# Altium footprint library Reflow3D1411sep.PcbLib: 657 footprints (part 27 of 42)
Each footprint in its own frame and in the unit in brackets; x right, y up, seen from the top. Pads: shape width x height; smd on the part's side, far side on the other; paste and mask are expansions set on the pad; w line width, h text height; cw(c..) or ccw(c..) is an arc to the next point about the centre after c.
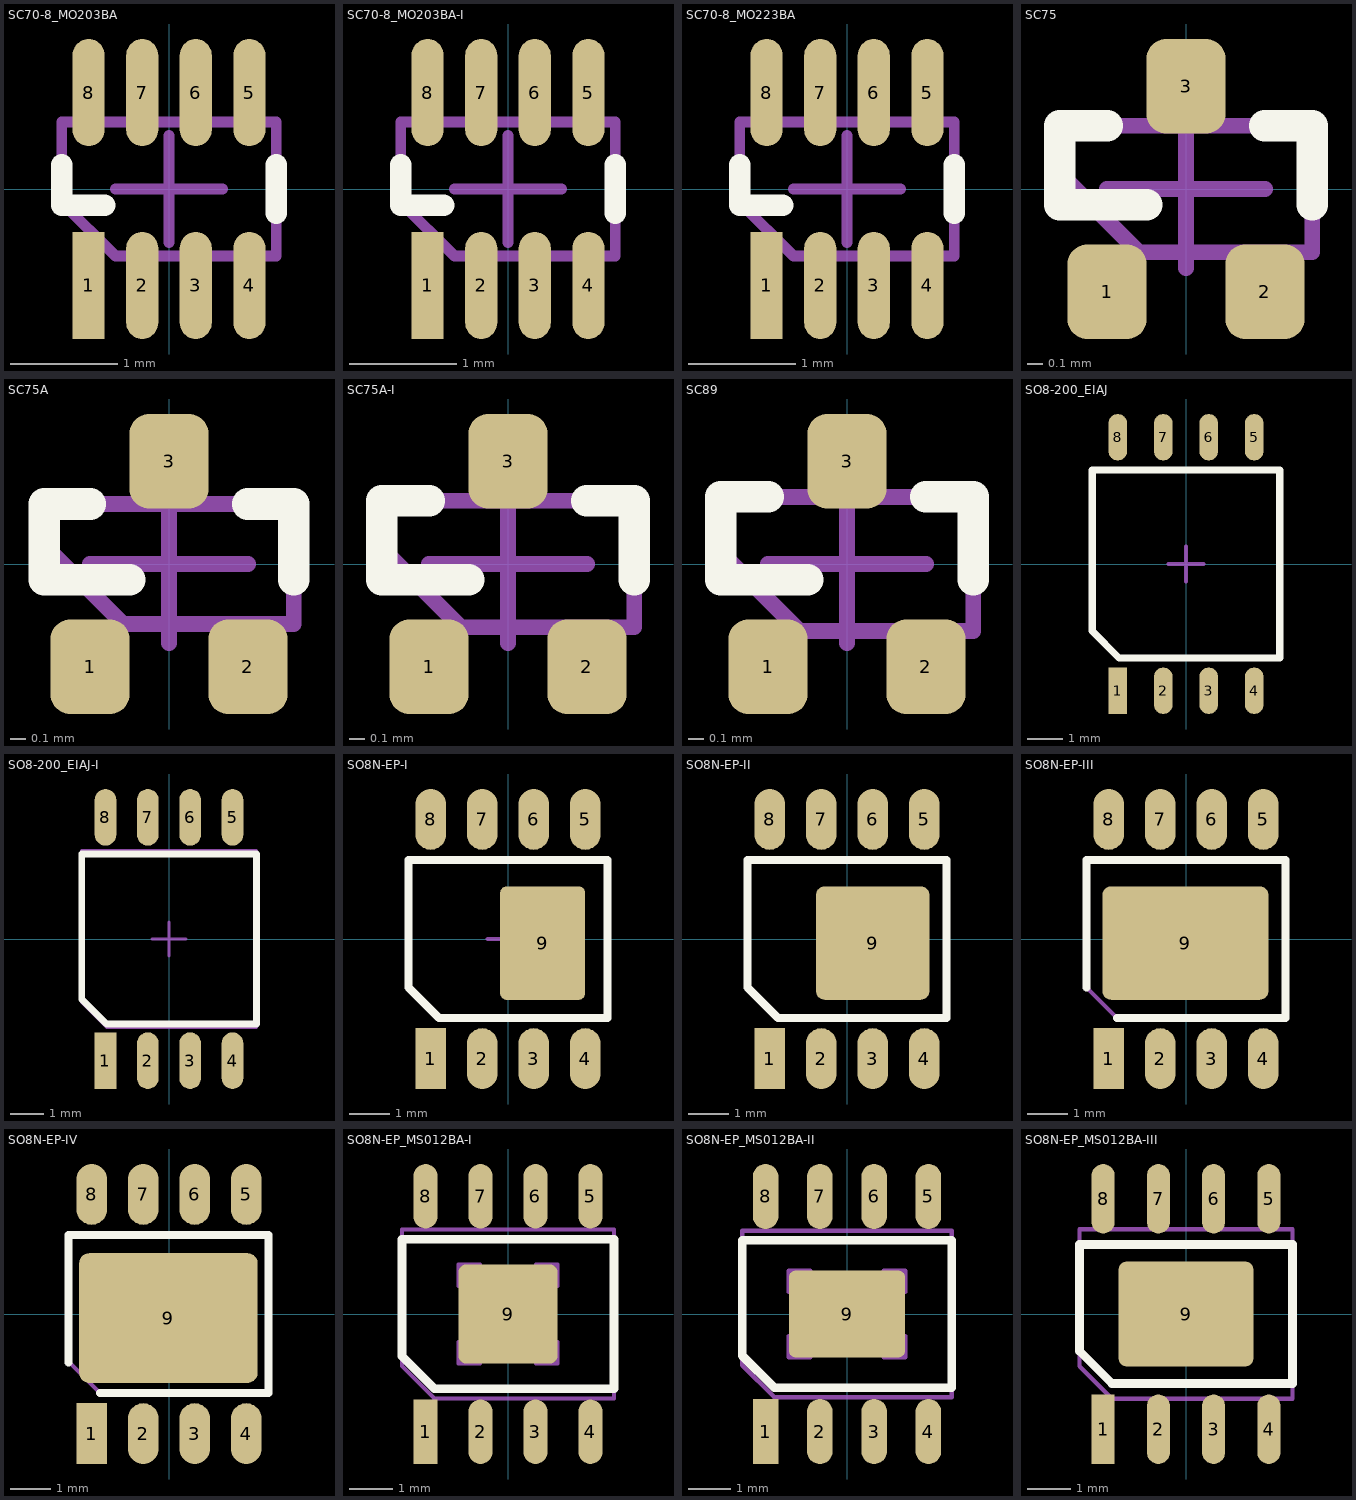
[diagram p26: the footprints below, top view; thin cyan lines are the x and y axes]

## SC70-8_MO203BA [mm] "www.maxim-ic.com, 21-0460.PDF; www.linear.com, SC8.pdf; www.jedec.org, Mo-203b.PDF"
height 0.95
pads (8):
  rect 0.3x1 smd mask+0.05: 1(-0.75,-0.9)
  oval 0.3x1 smd mask+0.05: 2(-0.25,-0.9) 3(0.25,-0.9) 4(0.75,-0.9) 5(0.75,0.9) 6(0.25,0.9) 7(-0.25,0.9) 8(-0.75,0.9)
Top Overlay:
  lines w0.2: -1,0.225 -1,-0.15 -0.6,-0.15 ; 1,-0.225 1,0.225
Mechanical 13:
  lines w0.1: -1,-0.125 -0.5,-0.625 1,-0.625 1,0.625 -1,0.625 -1,-0.125
Mechanical 15:
  lines w0.1: -0.5,0 0.5,0 ; 0,-0.5 0,0.5
3D body: height 1.1, standoff 0, extent -1.1,-0.675 1.1,0.675

## SC70-8_MO203BA-I [mm] "www.linear.com, SC8.pdf; www.jedec.org, Mo-203b.PDF"
height 0.9
pads (8):
  rect 0.3x1 smd mask+0.05: 1(-0.75,-0.9)
  oval 0.3x1 smd mask+0.05: 2(-0.25,-0.9) 3(0.25,-0.9) 4(0.75,-0.9) 5(0.75,0.9) 6(0.25,0.9) 7(-0.25,0.9) 8(-0.75,0.9)
Top Overlay:
  lines w0.2: -1,0.225 -1,-0.15 -0.6,-0.15 ; 1,-0.225 1,0.225
Mechanical 13:
  lines w0.1: -1,-0.125 -0.5,-0.625 1,-0.625 1,0.625 -1,0.625 -1,-0.125
Mechanical 15:
  lines w0.1: -0.5,0 0.5,0 ; 0,-0.5 0,0.5
3D body: height 1, standoff 0, extent -1.1,-0.675 1.1,0.675

## SC70-8_MO223BA [mm] "www.linear.com, SC8.pdf; www.jedec.org, MO-223A.pdf"
height 0.95
pads (8):
  rect 0.3x1 smd mask+0.05: 1(-0.75,-0.9)
  oval 0.3x1 smd mask+0.05: 2(-0.25,-0.9) 3(0.25,-0.9) 4(0.75,-0.9) 5(0.75,0.9) 6(0.25,0.9) 7(-0.25,0.9) 8(-0.75,0.9)
Top Overlay:
  lines w0.2: -1,0.225 -1,-0.15 -0.6,-0.15 ; 1,-0.225 1,0.225
Mechanical 13:
  lines w0.1: -1,-0.125 -1,0.625 1,0.625 1,-0.625 -0.5,-0.625 -1,-0.125
Mechanical 15:
  lines w0.1: -0.5,0 0.5,0 ; 0,-0.5 0,0.5
3D body: height 1.1, standoff 0, extent -1.1,-0.675 1.1,0.675

## SC75 [mm] "www.nxp.com, SOT416.pdf, SOT416_fr.pdf"
height 0.78
pads (3):
  rrect50% 0.5x0.6 smd mask+0.075: 1(-0.5,-0.65) 2(0.5,-0.65) 3(0,0.65)
Top Overlay:
  lines w0.2: -0.5,0.4 -0.8,0.4 -0.8,-0.1 -0.25,-0.1 ; 0.5,0.4 0.8,0.4 0.8,-0.1
Mechanical 13:
  lines w0.1: -0.8,0.1 -0.8,0.4 0.8,0.4 0.8,-0.4 -0.3,-0.4 -0.8,0.1
Mechanical 15:
  lines w0.1: -0.5,0 0.5,0 ; 0,-0.5 0,0.5
3D body: height 0.95, standoff 0, extent -0.9,-0.45 0.9,0.45

## SC75A [mm] "www.vishay.com, 71348.pdf; www.nxp.com, SOT416_fr.pdf"
height 0.75
pads (3):
  rrect50% 0.5x0.6 smd mask+0.075: 1(-0.5,-0.65) 2(0.5,-0.65) 3(0,0.65)
Top Overlay:
  lines w0.2: -0.5,0.38 -0.79,0.38 -0.79,-0.1 -0.25,-0.1 ; 0.5,0.38 0.79,0.38 0.79,-0.1
Mechanical 13:
  lines w0.1: -0.79,0.12 -0.29,-0.38 0.79,-0.38 0.79,0.38 -0.79,0.38 -0.79,0.12
Mechanical 15:
  lines w0.1: -0.5,0 0.5,0 ; 0,-0.5 0,0.5
3D body: height 0.8, standoff 0, extent -0.8,-0.4 0.8,0.4

## SC75A-I [mm] "www.nxp.com, SOT416_fr.pdf; www.jeita.or.jp, ED-7500A.pdf"
height 0.78
pads (3):
  rrect50% 0.5x0.6 smd mask+0.075: 1(-0.5,-0.65) 2(0.5,-0.65) 3(0,0.65)
Top Overlay:
  lines w0.2: -0.5,0.4 -0.8,0.4 -0.8,-0.1 -0.25,-0.1 ; 0.5,0.4 0.8,0.4 0.8,-0.1
Mechanical 13:
  lines w0.1: -0.8,0.1 -0.8,0.4 0.8,0.4 0.8,-0.4 -0.3,-0.4 -0.8,0.1
Mechanical 15:
  lines w0.1: -0.5,0 0.5,0 ; 0,-0.5 0,0.5
3D body: height 0.95, standoff 0, extent -0.9,-0.45 0.9,0.45

## SC89 [mm] "www.nxp.com, sot490_po.pdf, SOT416_fr.pdf"
height 0.7
pads (3):
  rrect50% 0.5x0.6 smd mask+0.075: 1(-0.5,-0.65) 2(0.5,-0.65) 3(0,0.65)
Top Overlay:
  lines w0.2: -0.5,0.425 -0.8,0.425 -0.8,-0.1 -0.25,-0.1 ; 0.5,0.425 0.8,0.425 0.8,-0.1
Mechanical 13:
  lines w0.1: -0.8,0.075 -0.8,0.425 0.8,0.425 0.8,-0.425 -0.3,-0.425 -0.8,0.075
Mechanical 15:
  lines w0.1: -0.5,0 0.5,0 ; 0,-0.5 0,0.5
3D body: height 0.8, standoff 0, extent -0.85,-0.475 0.85,0.475

## SO8-200_EIAJ [mm] "www.atmel.com, 2586S.pdf, 8S2; www.st.com, CD00273765.pdf"
height 1.93
pads (8):
  rect 0.52x1.3 smd mask+0.075: 1(-1.905,-3.54)
  oval 0.52x1.3 smd mask+0.075: 2(-0.635,-3.54) 3(0.635,-3.54) 4(1.905,-3.54) 5(1.905,3.54) 6(0.635,3.54) 7(-0.635,3.54) 8(-1.905,3.54)
Top Overlay:
  lines w0.2: -2.62,-1.875 -2.62,2.625 2.62,2.625 2.62,-2.625 -1.87,-2.625 ; -2.62,-1.875 -1.87,-2.625
Mechanical 13:
  lines w0.1: -2.62,-1.895 -1.87,-2.645 2.62,-2.645 2.62,2.645 -2.62,2.645 -2.62,-1.895
Mechanical 15:
  lines w0.1: -0.5,0 0.5,0 ; 0,-0.5 0,0.5
3D body: height 2.16, standoff 0, extent -2.675,-2.7 2.675,2.7

## SO8-200_EIAJ-I [mm] "www.atmel.com, 2586S.pdf, 8S2; www.microchip.com, en012702.pdf"
height 1.93
pads (8):
  rect 0.65x1.7 smd mask+0.075: 1(-1.905,-3.65)
  oval 0.65x1.7 smd mask+0.075: 2(-0.635,-3.65) 3(0.635,-3.65) 4(1.905,-3.65) 5(1.905,3.65) 6(0.635,3.65) 7(-0.635,3.65) 8(-1.905,3.65)
Top Overlay:
  lines w0.2: -1.87,-2.55 2.625,-2.55 2.625,2.55 -2.62,2.55 -2.62,-1.8 -1.87,-2.55
Mechanical 13:
  lines w0.1: -2.62,-1.895 -2.62,2.645 2.62,2.645 2.62,-2.645 -1.87,-2.645 -2.62,-1.895
Mechanical 15:
  lines w0.1: -0.5,0 0.5,0 ; 0,-0.5 0,0.5
3D body: height 2.16, standoff 0, extent -2.675,-2.7 2.675,2.7

## SO8N-EP-I [mm] "www.fairchildsemi.com, M08B.pdf"
height 1.5
pads (9):
  rect 0.75x1.5 smd mask+0.075: 1(-1.905,-2.95)
  oval 0.75x1.5 smd mask+0.075: 2(-0.635,-2.95) 3(0.635,-2.95) 4(1.905,-2.95) 5(1.905,2.95) 6(0.635,2.95) 7(-0.635,2.95) 8(-1.905,2.95)
  rrect15% 2.1x2.8 smd mask+0.075: 9(0.855,-0.1)
Top Overlay:
  lines w0.2: -2.45,-1.2 -1.7,-1.95 2.45,-1.95 2.45,1.95 -2.45,1.95 -2.45,-1.2
Mechanical 13:
  lines w0.1: 0.05,-0.78 0.05,-1.28 0.55,-1.28 ; 0.05,0.58 0.05,1.08 0.55,1.08 ; 1.2,-1.28 1.7,-1.28 1.7,-0.78 ; 1.2,1.08 1.7,1.08 1.7,0.58 ; -2.45,-1.2 -2.45,1.95 2.45,1.95 2.45,-1.95 -1.7,-1.95 -2.45,-1.2
Mechanical 15:
  lines w0.1: -0.5,0 0.5,0 ; 0,-0.5 0,0.5
3D body: height 1.6, standoff 0, extent -2.5,-2 2.5,2

## SO8N-EP-II [mm] "www.fairchildsemi.com, M08B.pdf"
height 1.5
pads (9):
  rect 0.75x1.5 smd mask+0.075: 1(-1.905,-2.95)
  oval 0.75x1.5 smd mask+0.075: 2(-0.635,-2.95) 3(0.635,-2.95) 4(1.905,-2.95) 5(1.905,2.95) 6(0.635,2.95) 7(-0.635,2.95) 8(-1.905,2.95)
  rrect15% 2.8x2.8 smd mask+0.075: 9(0.635,-0.1)
Top Overlay:
  lines w0.2: -2.45,-1.2 -1.7,-1.95 2.45,-1.95 2.45,1.95 -2.45,1.95 -2.45,-1.2
Mechanical 13:
  lines w0.1: -0.56,-0.78 -0.56,-1.28 -0.06,-1.28 ; -0.56,0.58 -0.56,1.08 -0.06,1.08 ; 1.3,-1.28 1.8,-1.28 1.8,-0.78 ; 1.3,1.08 1.8,1.08 1.8,0.58 ; -2.45,-1.2 -2.45,1.95 2.45,1.95 2.45,-1.95 -1.7,-1.95 -2.45,-1.2
Mechanical 15:
  lines w0.1: -0.5,0 0.5,0 ; 0,-0.5 0,0.5
3D body: height 1.6, standoff 0, extent -2.5,-2 2.5,2

## SO8N-EP-III [mm] "www.fairchildsemi.com, M08B.pdf"
height 1.5
pads (9):
  rect 0.75x1.5 smd mask+0.075: 1(-1.905,-2.95)
  oval 0.75x1.5 smd mask+0.075: 2(-0.635,-2.95) 3(0.635,-2.95) 4(1.905,-2.95) 5(1.905,2.95) 6(0.635,2.95) 7(-0.635,2.95) 8(-1.905,2.95)
  rrect15% 4.1x2.8 smd mask+0.075: 9(-0.015,-0.1)
Top Overlay:
  lines w0.2: -2.45,-1.2 -2.45,1.95 2.45,1.95 2.45,-1.95 -1.7,-1.95
Mechanical 13:
  lines w0.1: -1.88,-0.78 -1.88,-1.28 -1.38,-1.28 ; -1.88,0.58 -1.88,1.08 -1.38,1.08 ; 1.3,-1.28 1.8,-1.28 1.8,-0.78 ; 1.3,1.08 1.8,1.08 1.8,0.58 ; -2.45,-1.2 -1.7,-1.95 2.45,-1.95 2.45,1.95 -2.45,1.95 -2.45,-1.2
Mechanical 15:
  lines w0.1: -0.5,0 0.5,0 ; 0,-0.5 0,0.5
3D body: height 1.6, standoff 0, extent -2.5,-2 2.5,2

## SO8N-EP-IV [mm] "www.fairchildsemi.com, M08B.pdf"
height 1.5
pads (9):
  rect 0.75x1.5 smd mask+0.075: 1(-1.905,-2.95)
  oval 0.75x1.5 smd mask+0.075: 2(-0.635,-2.95) 3(0.635,-2.95) 4(1.905,-2.95) 5(1.905,2.95) 6(0.635,2.95) 7(-0.635,2.95) 8(-1.905,2.95)
  rrect15% 4.4x3.2 smd mask+0.075: 9(-0.015,-0.1)
Top Overlay:
  lines w0.2: -2.475,-1.2 -2.475,1.95 2.45,1.95 2.45,-1.95 -1.7,-1.95
Mechanical 13:
  lines w0.1: -2.02,-1.04 -2.02,-1.54 -1.52,-1.54 ; -2.02,0.76 -2.02,1.26 -1.52,1.26 ; 1.52,-1.54 2.02,-1.54 2.02,-1.04 ; 1.52,1.26 2.02,1.26 2.02,0.76 ; -2.45,-1.2 -1.7,-1.95 2.45,-1.95 2.45,1.95 -2.45,1.95 -2.45,-1.2
Mechanical 15:
  lines w0.1: -0.5,0 0.5,0 ; 0,-0.5 0,0.5
3D body: height 1.6, standoff 0, extent -2.5,-2 2.5,2

## SO8N-EP_MS012BA-I [mm] "www.analog.com, RD_8_1.pdf, RD-8-1.pdf; www.jedec.org, MS-012F.pdf"
height 1.55
pads (9):
  rect 0.55x1.49 smd mask+0.075: 1(-1.905,-2.72)
  oval 0.55x1.49 smd mask+0.075: 2(-0.635,-2.72) 3(0.635,-2.72) 4(1.905,-2.72) 5(1.905,2.72) 6(0.635,2.72) 7(-0.635,2.72) 8(-1.905,2.72)
  rrect15% 2.29x2.29 smd mask+0.075: 9(0,0)
Top Overlay:
  lines w0.2: -2.45,-0.975 -2.45,1.725 2.45,1.725 2.45,-1.725 -1.7,-1.725 -2.45,-0.975
Mechanical 13:
  lines w0.1: -1.145,-0.645 -1.145,-1.145 -0.645,-1.145 ; -1.145,0.645 -1.145,1.145 -0.645,1.145 ; 0.645,-1.145 1.145,-1.145 1.145,-0.645 ; 0.645,1.145 1.145,1.145 1.145,0.645 ; -2.45,-1.2 -1.7,-1.95 2.45,-1.95 2.45,1.95 -2.45,1.95 -2.45,-1.2
Mechanical 15:
  lines w0.1: -0.5,0 0.5,0 ; 0,-0.5 0,0.5
3D body: height 1.75, standoff 0, extent -2.5,-2 2.5,2

## SO8N-EP_MS012BA-II [mm] "www.onsemi.com, 751AC.PDF; www.jedec.org, MS-012F.pdf"
height 1.55
pads (9):
  rect 0.6x1.52 smd mask+0.075: 1(-1.905,-2.75)
  oval 0.6x1.52 smd mask+0.075: 2(-0.635,-2.75) 3(0.635,-2.75) 4(1.905,-2.75) 5(1.905,2.75) 6(0.635,2.75) 7(-0.635,2.75) 8(-1.905,2.75)
  rrect15% 2.72x2.03 smd mask+0.075: 9(0,0)
Top Overlay:
  lines w0.2: -2.45,-0.975 -2.45,1.725 2.45,1.725 2.45,-1.725 -1.7,-1.725 -2.45,-0.975
Mechanical 13:
  lines w0.1: -1.36,-0.515 -1.36,-1.015 -0.86,-1.015 ; -1.36,0.515 -1.36,1.015 -0.86,1.015 ; 0.86,-1.015 1.36,-1.015 1.36,-0.515 ; 0.86,1.015 1.36,1.015 1.36,0.515 ; -2.45,-1.2 -1.7,-1.95 2.45,-1.95 2.45,1.95 -2.45,1.95 -2.45,-1.2
Mechanical 15:
  lines w0.1: -0.5,0 0.5,0 ; 0,-0.5 0,0.5
3D body: height 1.75, standoff 0, extent -2.5,-2 2.5,2

## SO8N-EP_MS012BA-III [mm] "www.maxim-ic.com, 21-0111.PDF, 90-0150.PDF"
height 1.55
pads (9):
  rect 0.53x1.6 smd mask+0.075: 1(-1.905,-2.65)
  oval 0.53x1.6 smd mask+0.075: 2(-0.635,-2.65) 3(0.635,-2.65) 4(1.905,-2.65) 5(1.905,2.65) 6(0.635,2.65) 7(-0.635,2.65) 8(-1.905,2.65)
  rrect15% 3.1x2.41 smd mask+0.075: 9(0,0)
Top Overlay:
  lines w0.2: -2.45,-0.85 -1.7,-1.6 2.45,-1.6 2.45,1.6 -2.45,1.6 -2.45,-0.85
Mechanical 13:
  lines w0.1: -1.07,-0.57 -1.07,-1.07 -0.57,-1.07 ; -1.07,0.57 -1.07,1.07 -0.57,1.07 ; 0.57,-1.07 1.07,-1.07 1.07,-0.57 ; 0.57,1.07 1.07,1.07 1.07,0.57 ; -2.45,-1.2 -2.45,1.95 2.45,1.95 2.45,-1.95 -1.7,-1.95 -2.45,-1.2
Mechanical 15:
  lines w0.1: -0.5,0 0.5,0 ; 0,-0.5 0,0.5
3D body: height 1.68, standoff 0, extent -2.49,-1.995 2.49,1.995